# Altium footprint library Connectors THD.PcbLib: 631 footprints (part 23 of 46)
Each footprint in its own frame and in the unit in brackets; x right, y up, seen from the top. Pads: shape width x height; smd on the part's side, far side on the other; paste and mask are expansions set on the pad; w line width, h text height; cw(c..) or ccw(c..) is an arc to the next point about the centre after c.
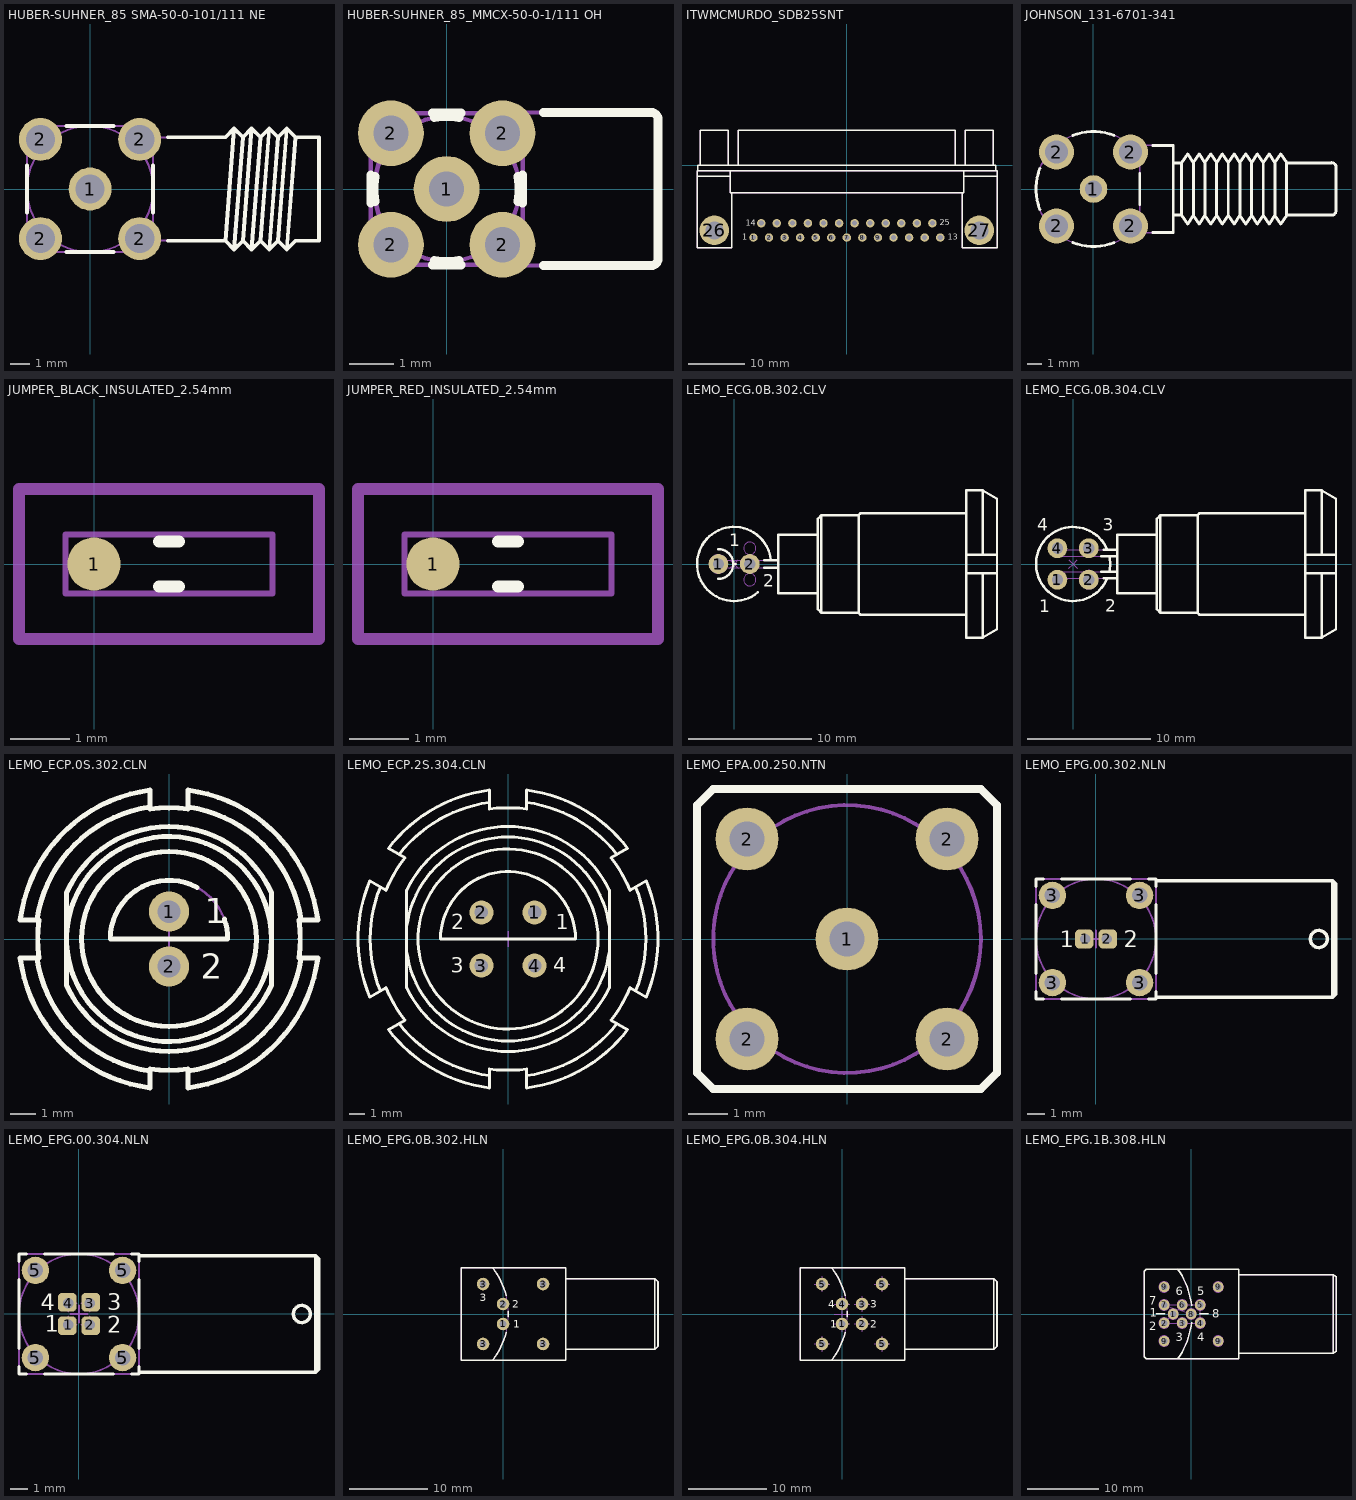
[diagram p22: the footprints below, top view; thin cyan lines are the x and y axes]

## HUBER-SUHNER_85 SMA-50-0-101/111 NE [mm] "50 Ohm SMA Right Angle PCB Jack"
height 9.6
pads (5):
  round 2.2 hole 1.5: 1(0,0) 2(-2.54,-2.54) 2(-2.54,2.54) 2(2.54,-2.54) 2(2.54,2.54)
Top Overlay:
  lines w0.2: -3.23,-1.208 -3.23,1.208 ; -1.208,-3.23 1.208,-3.23 ; -1.208,3.23 1.208,3.23 ; 3.23,-1.208 3.23,1.208 ; 4,-2.65 6.93,-2.65 ; 4,2.65 6.93,2.65 7.38,3.1 ; 6.93,-2.65 7.38,-3.1 ; 6.93,-2.65 7.38,3.1 ; 7.38,-3.1 7.83,-2.65 ; 7.38,-3.1 7.83,2.65 ; 7.38,3.1 7.83,2.65 ; 7.83,-2.65 8.28,-3.1 ; 7.83,-2.65 8.28,3.1 ; 7.83,2.65 8.28,3.1 ; 8.28,-3.1 8.73,-2.65 ; 8.28,-3.1 8.73,2.65 ; 8.28,3.1 8.73,2.65 ; 8.73,-2.65 9.18,-3.1 ; 8.73,-2.65 9.18,3.1 ; 8.73,2.65 9.18,3.1 ; 9.18,-3.1 9.63,-2.65 ; 9.18,-3.1 9.63,2.65 ; 9.18,3.1 9.63,2.65 ; 9.63,-2.65 10.08,-3.1 ; 9.63,-2.65 10.08,3.1 ; 9.63,2.65 10.08,3.1 ; 10.08,-3.1 10.53,-2.65 11.73,-2.65 11.73,2.65 10.53,2.65 ; 10.08,-3.1 10.53,2.65 ; 10.08,3.1 10.53,2.65
Mechanical 8:
  lines w0.1: -3.54,-2.54 -2.54,-2.54 ; -3.54,2.54 -2.54,2.54 ; -2.54,-3.54 -2.54,-2.54 ; -2.54,-1.54 -2.54,-2.54 ; -2.54,1.54 -2.54,2.54 ; -2.54,3.54 -2.54,2.54 ; -1.54,-2.54 -2.54,-2.54 ; -1.54,2.54 -2.54,2.54 ; -1,0 0,0 ; 0,-1 0,0 ; 0,1 0,0 ; 1,0 0,0 ; 1.54,-2.54 2.54,-2.54 ; 1.54,2.54 2.54,2.54 ; 2.54,-3.54 2.54,-2.54 ; 2.54,-1.54 2.54,-2.54 ; 2.54,1.54 2.54,2.54 ; 2.54,3.54 2.54,2.54 ; 3.54,-2.54 2.54,-2.54 ; 3.54,2.54 2.54,2.54
Mechanical 14:
  circle w0.1: c0,0 r0.63
  circle w0.1: c0,0 r3.23
  lines w0.1: 2.558,-3.23 3.23,-2.558 ; 3.23,-2.65 6.93,-2.65 ; 3.23,2.65 6.93,2.65 7.38,3.1 ; 6.93,-2.65 7.38,-3.1 ; 6.93,-2.65 7.38,3.1 ; 7.38,-3.1 7.83,-2.65 ; 7.38,-3.1 7.83,2.65 ; 7.38,3.1 7.83,2.65 ; 7.83,-2.65 8.28,-3.1 ; 7.83,-2.65 8.28,3.1 ; 7.83,2.65 8.28,3.1 ; 8.28,-3.1 8.73,-2.65 ; 8.28,-3.1 8.73,2.65 ; 8.28,3.1 8.73,2.65 ; 8.73,-2.65 9.18,-3.1 ; 8.73,-2.65 9.18,3.1 ; 8.73,2.65 9.18,3.1 ; 9.18,-3.1 9.63,-2.65 ; 9.18,-3.1 9.63,2.65 ; 9.18,3.1 9.63,2.65 ; 9.63,-2.65 10.08,-3.1 ; 9.63,-2.65 10.08,3.1 ; 9.63,2.65 10.08,3.1 ; 10.08,-3.1 10.53,-2.65 11.73,-2.65 11.73,2.65 10.53,2.65 ; 10.08,-3.1 10.53,2.65 ; 10.08,3.1 10.53,2.65 ; -3.23,-3.23 -3.23,3.23 3.23,3.23 3.23,-3.23 -3.23,-3.23
3D body: height 9.6, standoff -4, extent -3.23,-3.23 11.73,3.23

## HUBER-SUHNER_85_MMCX-50-0-1/111 OH [mm] "MMCX 50 Ohm Right Angle PCB Jack"
height 3.8
pads (5):
  round 1.5 hole 0.8: 1(0,0) 2(-1.27,-1.27) 2(-1.27,1.27) 2(1.27,-1.27) 2(1.27,1.27)
Top Overlay:
  lines w0.2: -1.73,-0.326 -1.73,0.326 ; -1.626,-0.282 cw(c0,0) -1.626,0.282 ; -0.326,-1.73 0.326,-1.73 ; -0.326,1.73 0.326,1.73 ; -0.282,-1.626 ccw(c0,0) 0.282,-1.626 ; -0.282,1.626 cw(c0,0) 0.282,1.626 ; 1.626,-0.282 ccw(c0,0) 1.626,0.282 ; 2.208,-1.743 4.665,-1.743 ccw(c4.665,-1.593) 4.815,-1.593 4.815,1.593 ccw(c4.665,1.593) 4.665,1.743 2.208,1.743 ; 1.73,-0.326 1.73,0.326 1.73,-0.326
Mechanical 8:
  lines w0.1: -1.77,-1.27 -1.27,-1.27 ; -1.77,1.27 -1.27,1.27 ; -1.27,-1.77 -1.27,-1.27 ; -1.27,-0.77 -1.27,-1.27 ; -1.27,0.77 -1.27,1.27 ; -1.27,1.77 -1.27,1.27 ; -0.77,-1.27 -1.27,-1.27 ; -0.77,1.27 -1.27,1.27 ; -0.5,0 0,0 ; 0,-0.5 0,0 ; 0,0.5 0,0 ; 0.5,0 0,0 ; 0.77,-1.27 1.27,-1.27 ; 0.77,1.27 1.27,1.27 ; 1.27,-1.77 1.27,-1.27 ; 1.27,-0.77 1.27,-1.27 ; 1.27,0.77 1.27,1.27 ; 1.27,1.77 1.27,1.27 ; 1.77,-1.27 1.27,-1.27 ; 1.77,1.27 1.27,1.27
Mechanical 14:
  circle w0.1: c0,0 r1.65
  lines w0.1: -1.73,-1.73 1.73,-1.73 1.73,1.73 -1.73,1.73 -1.73,-1.73 ; 1.73,-1.743 1.73,1.743 4.665,1.743 cw(c4.665,1.593) 4.815,1.593 4.815,-1.593 cw(c4.665,-1.593) 4.665,-1.743 1.73,-1.743
3D body: height 3.8, standoff -3, extent -1.73,-1.742 4.815,1.743

## ITWMCMURDO_SDB25SNT [mm] "25 Way Right Angled Female D-sub Connector"
height 12.5
pads (27):
  round 1.5 hole 0.9: 1(-16.56,-12.84) 2(-13.8,-12.84) 3(-11.04,-12.84) 4(-8.28,-12.84) 5(-5.52,-12.84) 6(-2.76,-12.84) 7(0,-12.84) 8(2.76,-12.84) 9(5.52,-12.84) 10(8.28,-12.84) 11(11.04,-12.84) 12(13.8,-12.84) 13(16.56,-12.84) 14(-15.18,-10.3) 15(-12.42,-10.3) 16(-9.66,-10.3) 17(-6.9,-10.3) 18(-4.14,-10.3) 19(-1.38,-10.3) 20(1.38,-10.3) 21(4.14,-10.3) 22(6.9,-10.3) 23(9.66,-10.3) 24(12.42,-10.3) 25(15.18,-10.3)
  round 5.25 hole 3.2: 26(-23.5,-11.57) 27(23.5,-11.57)
Top Overlay:
  lines w0.254: -26.571,-2 -20.671,-2 ; -26.45,-1 -26.45,0 26.45,0 26.45,-1 ; -26,0 -26,6.2 -21,6.2 -21,0 ; -20.671,-1 -20.671,-4.9 20.729,-4.9 20.729,-1 ; -20.371,-4.9 -20.371,-14.67 -26.571,-14.67 -26.571,-1 26.629,-1 26.629,-14.67 20.429,-14.67 20.429,-4.9 ; -19.25,0 -19.25,6.2 19.25,6.2 19.25,0 ; 20.729,-2 26.629,-2 ; 21,0 21,6.2 26,6.2 26,0
  text "25" at 16.51,-10.668 h1.02
  text "14" at -17.907,-10.795 h1.02
  text "13" at 17.907,-13.208 h1.02
  text "1" at -18.542,-13.208 h1.02
Mechanical 14:
  lines w0.1: -26.571,-2 -20.671,-2 ; -26.45,-1 -26.45,0 26.45,0 26.45,-1 ; -26,0 -26,6.2 -21,6.2 -21,0 ; -20.671,-1 -20.671,-4.9 20.729,-4.9 20.729,-1 ; -20.371,-4.9 -20.371,-14.67 -26.571,-14.67 -26.571,-1 26.629,-1 26.629,-14.67 20.429,-14.67 20.429,-4.9 ; -19.25,0 -19.25,6.2 19.25,6.2 19.25,0 ; 20.729,-2 26.629,-2 ; 21,0 21,6.2 26,6.2 26,0
  text "25" at 16.51,-10.668 h1.02
  text "14" at -17.907,-10.795 h1.02
  text "13" at 17.907,-13.208 h1.02
  text "1" at -18.542,-13.208 h1.02
3D body: height 12.93, standoff -5, extent -26.71,-14.67 26.71,6.2

## JOHNSON_131-6701-341 [mm] "Right Angle Bulkhead SMC"
height 7.67
pads (5):
  round 1.9 hole 1.2: 1(0,0)
  round 2.4 hole 1.6: 2(-2.54,-2.54) 2(-2.54,2.54) 2(2.54,-2.54) 2(2.54,2.54)
Top Overlay:
  lines w0.2: -3.685,-1.422 cw(c0,0) -3.685,1.422 ; -1.422,-3.685 ccw(c0,0) 1.422,-3.685 ; -1.422,3.685 cw(c0,0) 1.422,3.685 ; 3.18,-1.074 3.18,1.074 ; 4.072,-3 5.48,-3 5.48,3 4.072,3 ; 5.48,-1.8 6.06,-1.8 ; 5.48,1.8 6.06,1.8 ; 6.86,1.8 6.86,-1.81 ; 7.66,1.8 7.66,-1.81 ; 8.46,1.8 8.46,-1.81 ; 9.26,1.8 9.26,-1.81 ; 10.06,1.8 10.06,-1.81 ; 10.86,1.8 10.86,-1.81 ; 11.66,1.8 11.66,-1.81 ; 12.46,1.8 12.46,-1.81 ; 13.26,-1.8 16.36,-1.8 ccw(c16.36,-1.5) 16.66,-1.5 16.66,1.5 ccw(c16.36,1.507) 16.296,1.8 ; 13.26,1.81 12.86,2.41 12.46,1.81 12.06,2.41 11.66,1.81 11.26,2.41 10.86,1.81 10.46,2.41 10.06,1.81 9.66,2.41 9.26,1.81 8.86,2.41 8.46,1.81 8.06,2.41 7.66,1.81 7.26,2.41 6.86,1.81 6.46,2.41 6.06,1.81 6.06,-1.81 6.46,-2.41 6.86,-1.81 ; 16.36,1.8 13.26,1.8 13.26,-1.81 12.86,-2.41 12.46,-1.81 ; 6.86,-1.81 7.26,-2.41 7.66,-1.81 ; 7.66,-1.81 8.06,-2.41 8.46,-1.81 ; 8.46,-1.81 8.86,-2.41 9.26,-1.81 ; 9.26,-1.81 9.66,-2.41 10.06,-1.81 ; 10.06,-1.81 10.46,-2.41 10.86,-1.81 ; 10.86,-1.81 11.26,-2.41 11.66,-1.81 ; 11.66,-1.81 12.06,-2.41 12.46,-1.81
Mechanical 8:
  lines w0.1: -3.04,-2.54 -2.54,-2.54 ; -3.04,2.54 -2.54,2.54 ; -2.54,-3.04 -2.54,-2.54 ; -2.54,-2.04 -2.54,-2.54 ; -2.54,2.04 -2.54,2.54 ; -2.54,3.04 -2.54,2.54 ; -2.04,-2.54 -2.54,-2.54 ; -2.04,2.54 -2.54,2.54 ; -0.5,0 0,0 ; 0,-0.5 0,0 ; 0,0.5 0,0 ; 0.5,0 0,0 ; 2.04,-2.54 2.54,-2.54 ; 2.04,2.54 2.54,2.54 ; 2.54,-3.04 2.54,-2.54 ; 2.54,-2.04 2.54,-2.54 ; 2.54,2.04 2.54,2.54 ; 2.54,3.04 2.54,2.54 ; 3.04,-2.54 2.54,-2.54 ; 3.04,2.54 2.54,2.54
Mechanical 14:
  lines w0.1: 3.18,-2.343 cw(c0,0) 3.18,2.343 ; 5.48,-1.8 6.06,-1.8 ; 5.48,1.8 6.06,1.8 ; 6.86,1.8 6.86,-1.81 ; 7.66,1.8 7.66,-1.81 ; 8.46,1.8 8.46,-1.81 ; 9.26,1.8 9.26,-1.81 ; 10.06,1.8 10.06,-1.81 ; 10.86,1.8 10.86,-1.81 ; 11.66,1.8 11.66,-1.81 ; 12.46,1.8 12.46,-1.81 ; 13.26,-1.8 16.36,-1.8 ccw(c16.36,-1.5) 16.66,-1.5 16.66,1.5 ccw(c16.36,1.507) 16.296,1.8 ; 13.26,1.81 12.86,2.41 12.46,1.81 12.06,2.41 11.66,1.81 11.26,2.41 10.86,1.81 10.46,2.41 10.06,1.81 9.66,2.41 9.26,1.81 8.86,2.41 8.46,1.81 8.06,2.41 7.66,1.81 7.26,2.41 6.86,1.81 6.46,2.41 6.06,1.81 6.06,-1.81 6.46,-2.41 6.86,-1.81 ; 16.36,1.8 13.26,1.8 13.26,-1.81 12.86,-2.41 12.46,-1.81 ; 6.86,-1.81 7.26,-2.41 7.66,-1.81 ; 7.66,-1.81 8.06,-2.41 8.46,-1.81 ; 8.46,-1.81 8.86,-2.41 9.26,-1.81 ; 9.26,-1.81 9.66,-2.41 10.06,-1.81 ; 10.06,-1.81 10.46,-2.41 10.86,-1.81 ; 10.86,-1.81 11.26,-2.41 11.66,-1.81 ; 11.66,-1.81 12.06,-2.41 12.46,-1.81 ; 3.18,-3 5.48,-3 5.48,3 3.18,3 3.18,-3
3D body: height 7.67, standoff -3.9, extent -3.943,-3.945 16.66,3.943
3D body: height 8.3, standoff 0.7, extent 7.84,-3.8 10.14,3.8

## JUMPER_BLACK_INSULATED_2.54mm [mm] "Black Insulated Jumper Pitch 2.54mm W=2.5mm L=5mm H=6.5mm"
height 6.5
pads (1):
  round 0.9 smd paste-0.46 mask-0.46: 1(0,0)
Top Overlay:
  lines w0.2: 1.1,-0.381 1.44,-0.381 ; 1.1,0.381 1.44,0.381
Mechanical 13:
  lines w0.2: -1.27,-1.27 3.81,-1.27 3.81,1.27 -1.27,1.27 -1.27,-1.27
Mechanical 14:
  lines w0.1: -0.48,-0.5 3.02,-0.5 3.02,0.5 -0.48,0.5 -0.48,-0.5
3D body: height 8.2, standoff 1.7, extent -1.269,-1.269 3.731,1.231

## JUMPER_RED_INSULATED_2.54mm [mm] "Red Insulated Jumper Pitch 2.54mm W=2.5mm L=5mm H=6.5mm"
height 6.5
pads (1):
  round 0.9 smd paste-0.46 mask-0.46: 1(0,0)
Top Overlay:
  lines w0.2: 1.1,-0.381 1.44,-0.381 ; 1.1,0.381 1.44,0.381
Mechanical 13:
  lines w0.2: -1.27,-1.27 -1.27,1.27 3.81,1.27 3.81,-1.27 -1.27,-1.27
Mechanical 14:
  lines w0.1: -0.48,-0.5 -0.48,0.5 3.02,0.5 3.02,-0.5 -0.48,-0.5
3D body: height 8.2, standoff 1.7, extent -1.269,-1.269 3.731,1.231

## LEMO_ECG.0B.302.CLV [mm] "Size 0B, 2 Female Contacts Elbow Receptacle (90°) With Two Nut For Panel Mounting"
height 15.5
pads (2):
  round 1.6 hole 0.9: 1(-1.27,0) 2(1.27,0)
Top Overlay:
  lines w0.2: -1.27,-1.2 ccw(c-1.27,0) -1.27,1.2 ; 0,0 0.125,0 ; 1.923,-2.303 cw(c0,0) 2.985,0.3 ; 2.432,-0.3 3.57,-0.3 ; 2.432,0.3 3.57,0.3 ; 6.77,-2.36 3.57,-2.36 3.57,2.36 6.77,2.36 ; 18.77,-4.1 10.22,-4.1 10.07,-3.95 ; 18.77,-0.75 21.27,-0.75 ; 18.77,0.75 21.27,0.75 ; 18.77,4.1 10.22,4.1 10.07,3.95 ; 20.12,-0.75 20.12,-5.953 ; 20.12,0.75 20.12,5.953 ; 7.07,-3.95 6.77,-3.65 6.77,3.65 7.07,3.95 ; 7.07,-3.95 10.07,-3.95 ; 7.07,-3.95 7.07,3.95 ; 7.07,3.95 10.07,3.95 ; 10.07,-3.95 10.07,3.95 ; 20.12,-5.953 21.27,-5.283 21.27,5.283 20.12,5.953 ; 20.12,-5.953 18.77,-5.953 18.77,5.953 20.12,5.953
  text "2" at 2.352,-1.842 h1
  text "1" at -0.4,1.425 h1
Mechanical 8:
  lines w0.1: -1.77,0 -1.27,0 ; -1.27,-0.5 -1.27,0 ; -1.27,0.5 -1.27,0 ; -0.77,0 -1.27,0 ; -0.354,-0.354 0,0 ; -0.354,0.354 0,0 ; 0.354,-0.354 0,0 ; 0.354,0.354 0,0 ; 0.77,0 1.27,0 ; 1.27,-0.5 1.27,0 ; 1.27,0.5 1.27,0 ; 1.77,0 1.27,0
Mechanical 14:
  circle w0.1: c1.27,1.27 r0.498
  circle w0.1: c1.27,-1.27 r0.498
  lines w0.1: -1.27,-1.2 ccw(c-1.27,0) -1.27,1.2 ; -0.583,-0.3 cw(c-1.27,0) -0.583,0.3 ; 0,0 0.125,0 ; 0.872,-0.3 ccw(c1.27,0) 1.668,-0.3 ; 0.872,0.3 cw(c1.27,0) 1.668,0.3 ; 1.923,-2.303 cw(c0,0) 2.985,0.3 ; 3.57,-0.3 -1.27,-0.3 cw(c-1.27,0) -1.27,0.3 3.57,0.3 ; 6.77,-2.36 3.57,-2.36 3.57,2.36 6.77,2.36 ; 18.77,-4.1 10.22,-4.1 10.07,-3.95 ; 18.77,-0.75 21.27,-0.75 ; 18.77,0.75 21.27,0.75 ; 18.77,4.1 10.22,4.1 10.07,3.95 ; 20.12,-0.75 20.12,-5.953 ; 20.12,0.75 20.12,5.953 ; 7.07,-3.95 6.77,-3.65 6.77,3.65 7.07,3.95 ; 7.07,-3.95 10.07,-3.95 ; 7.07,-3.95 7.07,3.95 ; 7.07,3.95 10.07,3.95 ; 10.07,-3.95 10.07,3.95 ; 20.12,-5.953 21.27,-5.283 21.27,5.283 20.12,5.953 ; 20.12,-5.953 18.77,-5.953 18.77,5.953 20.12,5.953
  text "2" at 2.352,-1.842 h1
  text "1" at -0.4,1.425 h1
3D body: height 10.73, standoff -3.7, extent -1.57,-4.1 21.27,4.1
3D body: height 12.2, standoff 0.3, extent 18.77,-5.953 21.27,5.953
3D body: height 12.5, standoff 0, extent 15.27,-6.25 16.27,6.25
3D body: height 12.45, standoff 0.05, extent 13.265,-5.5 15.265,5.5
3D body: height 2.3, standoff 0, extent -3,-3 3,3
3D body: height -3.7, standoff -8.7, extent -1.57,-0.3 1.57,0.3
3D body: height -8.7, standoff -13.7, extent -1.57,-0.3 1.57,0.3
3D body: height -8.7, standoff -13.7, extent -1.57,-0.3 1.57,0.3
3D body: height -13.7, standoff -18.7, extent -1.57,-0.3 1.57,0.3
3D body: height -18.7, standoff -23.7, extent -1.57,-0.3 1.57,0.3
3D body: height -23.7, standoff -28.7, extent -1.57,-0.3 1.57,0.3
3D body: height -28.7, standoff -33.7, extent -1.57,-0.3 1.57,0.3
3D body: height -33.7, standoff -38.7, extent -1.57,-0.3 1.57,0.3

## LEMO_ECG.0B.304.CLV [mm] "Size 0B, 4 Female Contacts Elbow Receptacle (90°) With Two Nut For Panel Mounting"
height 15.5
pads (4):
  round 1.6 hole 0.9: 1(-1.27,-1.27) 2(1.27,-1.27) 3(1.27,1.27) 4(-1.27,1.27)
Top Overlay:
  lines w0.2: 2.288,-0.634 3.57,-0.634 ; 2.288,0.634 3.57,0.634 ; 2.462,-1.134 3.57,-1.134 ; 2.462,1.134 3.57,1.134 ; 2.777,-1.134 cw(c0,0) 2.777,1.134 ; 2.932,-0.634 ccw(c0,0) 2.932,0.634 ; 6.77,-2.36 3.57,-2.36 3.57,2.36 6.77,2.36 ; 18.77,-4.1 10.22,-4.1 10.07,-3.95 ; 18.77,-0.75 21.27,-0.75 ; 18.77,0.75 21.27,0.75 ; 18.77,4.1 10.22,4.1 10.07,3.95 ; 20.12,-0.75 20.12,-5.953 ; 20.12,0.75 20.12,5.953 ; 21.27,-4.1 21.27,4.1 ; 7.07,-3.95 7.07,3.95 ; 7.07,-3.95 10.07,-3.95 ; 7.07,-3.95 6.77,-3.65 6.77,3.65 7.07,3.95 ; 7.07,3.95 10.07,3.95 ; 10.07,-3.95 10.07,3.95 ; 20.12,-5.953 18.77,-5.953 18.77,5.953 20.12,5.953 ; 20.12,-5.953 21.27,-5.283 21.27,5.283 20.12,5.953
  text "2" at 2.602,-3.868 h1
  text "1" at -2.75,-3.9 h1
  text "3" at 2.402,2.708 h1
  text "4" at -2.898,2.708 h1
Mechanical 8:
  lines w0.1: -1.77,-1.27 -1.27,-1.27 ; -1.77,1.27 -1.27,1.27 ; -1.27,-1.77 -1.27,-1.27 ; -1.27,-0.77 -1.27,-1.27 ; -1.27,0.77 -1.27,1.27 ; -1.27,1.77 -1.27,1.27 ; -0.77,-1.27 -1.27,-1.27 ; -0.77,1.27 -1.27,1.27 ; -0.354,-0.354 0,0 ; -0.354,0.354 0,0 ; 0.354,-0.354 0,0 ; 0.354,0.354 0,0 ; 0.77,-1.27 1.27,-1.27 ; 0.77,1.27 1.27,1.27 ; 1.27,-1.77 1.27,-1.27 ; 1.27,-0.77 1.27,-1.27 ; 1.27,0.77 1.27,1.27 ; 1.27,1.77 1.27,1.27 ; 1.77,-1.27 1.27,-1.27 ; 1.77,1.27 1.27,1.27
Mechanical 14:
  lines w0.1: -1.514,-1.055 ccw(c-1.27,-1.27) -0.969,-1.147 ; -1.514,1.055 cw(c-1.27,1.27) -0.969,1.147 ; 0.532,-1.134 ccw(c1.27,-1.27) 2.008,-1.134 ; 0.873,-0.634 cw(c1.27,-1.27) 1.667,-0.634 ; 0.975,1.134 cw(c1.27,1.27) 1.565,1.134 ; 1.02,-1.134 1.02,-1.27 ccw(c1.27,-1.27) 1.52,-1.27 1.52,-1.134 ; 1.02,1.134 1.02,1.27 cw(c1.27,1.27) 1.52,1.27 1.52,1.134 ; 2.777,-1.134 cw(c0,0) 2.777,1.134 ; 2.932,-0.634 ccw(c0,0) 2.932,0.634 ; 3.57,-1.134 -0.92,-1.134 ccw(c-0.92,-1.234) -1.02,-1.234 -1.02,-1.27 cw(c-1.27,-1.27) -1.52,-1.27 -1.52,-1.134 cw(c-1.02,-1.134) -1.02,-0.634 3.57,-0.634 ; 3.57,0.634 -1.02,0.634 cw(c-1.02,1.134) -1.52,1.134 -1.52,1.27 cw(c-1.27,1.27) -1.02,1.27 -1.02,1.234 ccw(c-0.92,1.234) -0.92,1.134 3.57,1.134 ; 6.77,-2.36 3.57,-2.36 3.57,2.36 6.77,2.36 ; 18.77,-4.1 10.22,-4.1 10.07,-3.95 ; 18.77,-0.75 21.27,-0.75 ; 18.77,0.75 21.27,0.75 ; 18.77,4.1 10.22,4.1 10.07,3.95 ; 20.12,-0.75 20.12,-5.953 ; 20.12,0.75 20.12,5.953 ; 21.27,-4.1 21.27,4.1 ; 7.07,-3.95 7.07,3.95 ; 7.07,-3.95 10.07,-3.95 ; 7.07,-3.95 6.77,-3.65 6.77,3.65 7.07,3.95 ; 7.07,3.95 10.07,3.95 ; 10.07,-3.95 10.07,3.95 ; 20.12,-5.953 18.77,-5.953 18.77,5.953 20.12,5.953 ; 20.12,-5.953 21.27,-5.283 21.27,5.283 20.12,5.953
  text "2" at 2.602,-3.868 h1
  text "1" at -2.75,-3.9 h1
  text "3" at 2.402,2.708 h1
  text "4" at -2.898,2.708 h1
3D body: height -33.7, standoff -38.7, extent -1.52,-1.52 1.52,1.52
3D body: height -28.7, standoff -33.7, extent -1.52,-1.52 1.52,1.52
3D body: height -23.7, standoff -28.7, extent -1.52,-1.52 1.52,1.52
3D body: height -8.7, standoff -13.7, extent -1.52,-1.52 1.52,1.52
3D body: height -3.7, standoff -8.7, extent -1.52,-1.52 1.52,1.52
3D body: height 12.2, standoff 0.3, extent 18.77,-5.953 21.27,5.953
3D body: height 10.75, standoff -3.7, extent -1.52,-4.1 21.27,4.1
3D body: height 12.5, standoff 0, extent 15.27,-6.25 16.27,6.25
3D body: height 12.45, standoff 0.05, extent 13.265,-5.5 15.265,5.5
3D body: height 2.3, standoff 0, extent -3,-3 3,3
3D body: height -13.7, standoff -18.7, extent -1.52,-1.52 1.52,1.52
3D body: height -18.7, standoff -23.7, extent -1.52,-1.52 1.52,1.52

## LEMO_ECP.0S.302.CLN [mm] "Size 0S, Fixed Receptacle with 2 Nuts, Straight Contacts 1 Female + 1 Male  (Hermaphroditic Keying)"
height 15
pads (2):
  round 1.6 hole 0.9: 1(0,1.1) 2(0,-1.1)
Top Overlay:
  circle w0.2: c0,0 r4.1
  circle w0.2: c0,0 r3.5
  lines w0.2: -5.283,-0.75 ccw(c0,0) -0.75,-5.283 ; -5.283,0.75 cw(c0,0) -0.75,5.283 ; 0.75,-5.283 ccw(c0,0) 5.283,-0.75 ; 0.75,5.283 cw(c0,0) 5.283,0.75 ; 1.114,2.069 ccw(c0,0) -2.35,0 2.35,0 ccw(c0,0) 2.213,0.79 ; -5.953,-0.75 ccw(c0,0) -0.75,-5.953 -0.75,-5.196 ccw(c0,0) 0.75,-5.196 0.75,-5.953 ccw(c0,0) 5.953,-0.75 5.196,-0.75 ccw(c0,0) 5.196,0.75 5.953,0.75 ccw(c0,0) 0.75,5.953 0.75,5.196 ccw(c0,0) -0.75,5.196 -0.75,5.953 ccw(c0,0) -5.953,0.75 -5.196,0.75 ccw(c0,0) -5.196,-0.75 -5.953,-0.75 ; -4.1,-1.855 ccw(c0,0) 4.1,-1.855 4.1,1.855 ccw(c0,0) -4.1,1.855 -4.1,-1.855
  text "1" at 1.429,0.635 h1
  text "2" at 1.27,-1.587 h1
Mechanical 8:
  lines w0.1: -0.5,-1.1 0,-1.1 ; -0.5,0 0,0 ; -0.5,1.1 0,1.1 ; 0,-1.6 0,-1.1 ; 0,-0.6 0,-1.1 ; 0,-0.5 0,0 ; 0,0.5 0,0 ; 0,0.6 0,1.1 ; 0,1.6 0,1.1 ; 0.5,-1.1 0,-1.1 ; 0.5,0 0,0 ; 0.5,1.1 0,1.1
Mechanical 14:
  circle w0.1: c0,0 r4.1
  circle w0.1: c0,0 r3.5
  circle w0.1: c0,1.1 r0.35
  circle w0.4: c0,-1.1 r0.2
  circle w0.1: c0,-1.1 r0.35
  lines w0.1: -5.283,-0.75 ccw(c0,0) -0.75,-5.283 ; -5.283,0.75 cw(c0,0) -0.75,5.283 ; 0.75,-5.283 ccw(c0,0) 5.283,-0.75 ; 0.75,5.283 cw(c0,0) 5.283,0.75 ; -5.953,-0.75 ccw(c0,0) -0.75,-5.953 -0.75,-5.196 ccw(c0,0) 0.75,-5.196 0.75,-5.953 ccw(c0,0) 5.953,-0.75 5.196,-0.75 ccw(c0,0) 5.196,0.75 5.953,0.75 ccw(c0,0) 0.75,5.953 0.75,5.196 ccw(c0,0) -0.75,5.196 -0.75,5.953 ccw(c0,0) -5.953,0.75 -5.196,0.75 ccw(c0,0) -5.196,-0.75 -5.953,-0.75 ; -4.1,-1.855 ccw(c0,0) 4.1,-1.855 4.1,1.855 ccw(c0,0) -4.1,1.855 -4.1,-1.855 ; -2.35,0 cw(c0,0) 2.35,0 -2.35,0
  text "1" at 1.429,0.635 h1
  text "2" at 1.27,-1.587 h1
3D body: height 15, standoff -3.2, extent -6.25,-6.25 6.25,6.216

## LEMO_ECP.2S.304.CLN [mm] "Size 2S, Fixed Receptacle with 2 Nuts, Straight Contacts 2 Females + 2 Males  (Hermaphroditic Keying)"
height 20
pads (4):
  round 1.6 hole 0.9: 1(1.768,1.768) 2(-1.768,1.768) 3(-1.768,-1.768) 4(1.768,-1.768)
Top Overlay:
  circle w0.2: c0,0 r6
  lines w0.2: -8.511,-3.471 cw(c0,0) -8.511,3.471 ; -7.261,-5.636 ccw(c0,0) -1.25,-9.106 ; -7.261,5.636 cw(c0,0) -1.25,9.106 ; -6.75,-0.823 ccw(c0,0) 6.75,-0.823 ; -6.75,0.823 cw(c0,0) 6.75,0.823 ; 1.25,-9.106 ccw(c0,0) 7.261,-5.636 ; 1.25,9.106 cw(c0,0) 7.261,5.636 ; 8.511,-3.471 ccw(c0,0) 8.511,3.471 ; -9.217,-3.878 cw(c0,0) -9.217,3.878 -8.125,3.248 cw(c0,0) -6.875,5.413 -7.967,6.043 cw(c0,0) -1.25,9.922 -1.25,8.66 cw(c0,0) 1.25,8.66 1.25,9.922 cw(c0,0) 7.967,6.043 6.875,5.413 cw(c0,0) 8.125,3.248 9.217,3.878 cw(c0,0) 9.217,-3.878 8.125,-3.248 cw(c0,0) 6.875,-5.413 7.967,-6.043 cw(c0,0) 1.25,-9.922 1.25,-8.66 cw(c0,0) -1.25,-8.66 -1.25,-9.922 cw(c0,0) -7.967,-6.043 -6.875,-5.413 cw(c0,0) -8.125,-3.248 -9.217,-3.878 ; -6.75,-3.269 ccw(c0,0) 6.75,-3.269 6.75,3.269 ccw(c0,0) -6.75,3.269 -6.75,-3.269 ; -4.5,0 cw(c0,0) 4.5,0 -4.5,0
  text "2" at -3.788,0.635 h1
  text "3" at -3.81,-2.244 h1
  text "4" at 3.016,-2.222 h1
  text "1" at 3.197,0.635 h1
Mechanical 8:
  lines w0.1: -2.268,-1.768 -1.768,-1.768 ; -2.268,1.768 -1.768,1.768 ; -1.768,-2.268 -1.768,-1.768 ; -1.768,-1.268 -1.768,-1.768 ; -1.768,1.268 -1.768,1.768 ; -1.768,2.268 -1.768,1.768 ; -1.268,-1.768 -1.768,-1.768 ; -1.268,1.768 -1.768,1.768 ; -0.5,0 0,0 ; 0,-0.5 0,0 ; 0,0.5 0,0 ; 0.5,0 0,0 ; 1.268,-1.768 1.768,-1.768 ; 1.268,1.768 1.768,1.768 ; 1.768,-2.268 1.768,-1.768 ; 1.768,-1.268 1.768,-1.768 ; 1.768,1.268 1.768,1.768 ; 1.768,2.268 1.768,1.768 ; 2.268,-1.768 1.768,-1.768 ; 2.268,1.768 1.768,1.768
Mechanical 14:
  circle w0.1: c0,0 r6
  circle w0.1: c1.768,1.768 r0.7
  circle w0.1: c-1.768,1.768 r0.7
  circle w0.1: c1.768,-1.768 r0.7
  circle w0.1: c-1.768,-1.768 r0.7
  circle w0.7: c-1.768,-1.768 r0.35
  circle w0.7: c1.768,-1.768 r0.35
  lines w0.1: -8.511,-3.471 cw(c0,0) -8.511,3.471 ; -7.261,-5.636 ccw(c0,0) -1.25,-9.106 ; -7.261,5.636 cw(c0,0) -1.25,9.106 ; -6.75,-0.823 ccw(c0,0) 6.75,-0.823 ; -6.75,0.823 cw(c0,0) 6.75,0.823 ; 1.25,-9.106 ccw(c0,0) 7.261,-5.636 ; 1.25,9.106 cw(c0,0) 7.261,5.636 ; 8.511,-3.471 ccw(c0,0) 8.511,3.471 ; -9.217,-3.878 cw(c0,0) -9.217,3.878 -8.125,3.248 cw(c0,0) -6.875,5.413 -7.967,6.043 cw(c0,0) -1.25,9.922 -1.25,8.66 cw(c0,0) 1.25,8.66 1.25,9.922 cw(c0,0) 7.967,6.043 6.875,5.413 cw(c0,0) 8.125,3.248 9.217,3.878 cw(c0,0) 9.217,-3.878 8.125,-3.248 cw(c0,0) 6.875,-5.413 7.967,-6.043 cw(c0,0) 1.25,-9.922 1.25,-8.66 cw(c0,0) -1.25,-8.66 -1.25,-9.922 cw(c0,0) -7.967,-6.043 -6.875,-5.413 cw(c0,0) -8.125,-3.248 -9.217,-3.878 ; -6.75,-3.269 ccw(c0,0) 6.75,-3.269 6.75,3.269 ccw(c0,0) -6.75,3.269 -6.75,-3.269 ; -4.5,0 cw(c0,0) 4.5,0 -4.5,0
  text "2" at -3.788,0.635 h1
  text "3" at -3.81,-2.244 h1
  text "4" at 3.016,-2.222 h1
  text "1" at 3.197,0.635 h1
3D body: height 20, standoff -3, extent -9.968,-9.921 9.968,9.922

## LEMO_EPA.00.250.NTN [mm] "50 Ohm size 00 Coaxial Straight socket"
height 14
pads (5):
  round 1.6 hole 0.9: 1(0,0) 2(-2.54,-2.54) 2(-2.54,2.54) 2(2.54,-2.54) 2(2.54,2.54)
Top Overlay:
  lines w0.2: -3.81,-3.4 -3.4,-3.81 3.4,-3.81 3.81,-3.4 3.81,3.4 3.4,3.81 -3.4,3.81 -3.81,3.4 -3.81,-3.4
Mechanical 14:
  circle w0.1: c0,0 r3.4
  lines w0.1: -3.81,-3.39 -3.81,3.39 -3.39,3.81 3.4,3.81 3.81,3.4 3.81,-3.39 3.39,-3.81 -3.39,-3.81 -3.81,-3.39
3D body: height 14, standoff -3, extent -3.5,-3.5 3.5,3.5

## LEMO_EPG.00.302.NLN [mm] "Multipole 2 Contacts, 50 Ohm size 00 Coaxial Elbow (90°) Socket With Key"
height 7
pads (6):
  rrect50% 1.1x1.1 hole 0.6 copper offset -0.05,0: 1(-0.635,0)
  rrect50% 1.1x1.1 hole 0.6 copper offset 0.05,0: 2(0.635,0)
  round 1.6 hole 0.9: 3(-2.54,-2.54) 3(-2.54,2.54) 3(2.54,-2.54) 3(2.54,2.54)
Top Overlay:
  circle w0.2: c13,0 r0.5
  lines w0.2: -3.5,-3.077 -3.5,-3.5 -3.077,-3.5 ; -3.5,-2.003 -3.5,2.003 ; -3.5,3.077 -3.5,3.5 -3.077,3.5 ; -2.003,-3.5 2.003,-3.5 ; -2.003,3.5 2.003,3.5 ; 3.077,-3.5 3.5,-3.5 3.5,-3.077 ; 3.077,3.5 3.5,3.5 3.5,3.077 ; 3.5,-3.4 13.8,-3.4 ; 3.5,-2.003 3.5,2.003 ; 3.5,3.399 13.8,3.4 ; 13.8,-3.4 13.8,3.4 ; 13.8,-3.4 14,-3.2 14,3.2 13.8,3.4
  text "2" at 1.613,-0.473 h0.97
  text "1" at -2.119,-0.48 h0.97
Mechanical 8:
  lines w0.1: -3.04,-2.54 -2.54,-2.54 ; -3.04,2.54 -2.54,2.54 ; -2.54,-3.04 -2.54,-2.54 ; -2.54,-2.04 -2.54,-2.54 ; -2.54,2.04 -2.54,2.54 ; -2.54,3.04 -2.54,2.54 ; -2.04,-2.54 -2.54,-2.54 ; -2.04,2.54 -2.54,2.54 ; -1.1,0 -0.6,0 ; -0.6,-0.5 -0.6,0 ; -0.6,0.5 -0.6,0 ; -0.5,0 0,0 ; -0.1,0 -0.6,0 ; 0,-0.5 0,0 ; 0,0.5 0,0 ; 0.1,0 0.6,0 ; 0.5,0 0,0 ; 0.6,-0.5 0.6,0 ; 0.6,0.5 0.6,0 ; 1.1,0 0.6,0 ; 2.04,-2.54 2.54,-2.54 ; 2.04,2.54 2.54,2.54 ; 2.54,-3.04 2.54,-2.54 ; 2.54,-2.04 2.54,-2.54 ; 2.54,2.04 2.54,2.54 ; 2.54,3.04 2.54,2.54 ; 3.04,-2.54 2.54,-2.54 ; 3.04,2.54 2.54,2.54
Mechanical 14:
  circle w0.1: c13,0 r0.5
  circle w0.1: c0,0 r3.5
  lines w0.1: 3.5,-3.4 13.8,-3.4 ; 3.5,3.399 13.8,3.4 ; 13.8,-3.4 13.8,3.4 ; 13.8,-3.4 14,-3.2 14,3.2 13.8,3.4 ; -3.5,-3.5 -3.5,3.5 3.5,3.5 3.5,-3.5 -3.5,-3.5
  text "2" at 1.613,-0.473 h0.97
  text "1" at -2.119,-0.48 h0.97
3D body: height 7, standoff -3, extent -3.5,-3.5 14,3.5

## LEMO_EPG.00.304.NLN [mm] "Multipole 4 Contacts, 50 Ohm size 00 Coaxial Elbow (90°) Socket With Key"
height 7
pads (8):
  rrect50% 1.1x1.1 hole 0.6 copper offset -0.05,-0.05: 1(-0.635,-0.635)
  rrect50% 1.1x1.1 hole 0.6 copper offset 0.05,-0.05: 2(0.635,-0.635)
  rrect50% 1.1x1.1 hole 0.6 copper offset 0.05,0.05: 3(0.635,0.635)
  rrect50% 1.1x1.1 hole 0.6 copper offset -0.05,0.05: 4(-0.635,0.635)
  round 1.6 hole 0.9: 5(-2.54,-2.54) 5(-2.54,2.54) 5(2.54,-2.54) 5(2.54,2.54)
Top Overlay:
  circle w0.2: c13,0 r0.5
  lines w0.2: -3.5,-3.077 -3.5,-3.5 -3.077,-3.5 ; -3.5,-2.003 -3.5,2.003 ; -3.5,3.077 -3.5,3.5 -3.077,3.5 ; -2.003,-3.5 2.003,-3.5 ; -2.003,3.5 2.003,3.5 ; 3.077,-3.5 3.5,-3.5 3.5,-3.077 ; 3.077,3.5 3.5,3.5 3.5,3.077 ; 3.5,-3.4 13.8,-3.4 ; 3.5,-2.003 3.5,2.003 ; 3.5,3.399 13.8,3.4 ; 13.8,-3.4 13.8,3.4 ; 13.8,-3.4 14,-3.2 14,3.2 13.8,3.4
  text "2" at 1.648,-1.108 h0.97
  text "3" at 1.652,0.208 h0.97
  text "4" at -2.231,0.232 h0.97
  text "1" at -2.007,-1.048 h0.97
Mechanical 8:
  lines w0.1: -3.04,-2.54 -2.54,-2.54 ; -3.04,2.54 -2.54,2.54 ; -2.54,-3.04 -2.54,-2.54 ; -2.54,-2.04 -2.54,-2.54 ; -2.54,2.04 -2.54,2.54 ; -2.54,3.04 -2.54,2.54 ; -2.04,-2.54 -2.54,-2.54 ; -2.04,2.54 -2.54,2.54 ; -1.135,-0.635 -0.635,-0.635 ; -1.135,0.635 -0.635,0.635 ; -0.635,-1.135 -0.635,-0.635 ; -0.635,-0.135 -0.635,-0.635 ; -0.635,0.135 -0.635,0.635 ; -0.635,1.135 -0.635,0.635 ; -0.5,0 0,0 ; -0.135,-0.635 -0.635,-0.635 ; -0.135,0.635 -0.635,0.635 ; 0,-0.5 0,0 ; 0,0.5 0,0 ; 0.135,-0.635 0.635,-0.635 ; 0.135,0.635 0.635,0.635 ; 0.5,0 0,0 ; 0.635,-1.135 0.635,-0.635 ; 0.635,-0.135 0.635,-0.635 ; 0.635,0.135 0.635,0.635 ; 0.635,1.135 0.635,0.635 ; 1.135,-0.635 0.635,-0.635 ; 1.135,0.635 0.635,0.635 ; 2.04,-2.54 2.54,-2.54 ; 2.04,2.54 2.54,2.54 ; 2.54,-3.04 2.54,-2.54 ; 2.54,-2.04 2.54,-2.54 ; 2.54,2.04 2.54,2.54 ; 2.54,3.04 2.54,2.54 ; 3.04,-2.54 2.54,-2.54 ; 3.04,2.54 2.54,2.54
Mechanical 14:
  circle w0.1: c13,0 r0.5
  circle w0.1: c0,0 r3.5
  lines w0.1: 3.5,-3.4 13.8,-3.4 ; 3.5,3.399 13.8,3.4 ; 13.8,-3.4 13.8,3.4 ; 13.8,-3.4 14,-3.2 14,3.2 13.8,3.4 ; -3.5,-3.5 -3.5,3.5 3.5,3.5 3.5,-3.5 -3.5,-3.5
  text "2" at 1.648,-1.108 h0.97
  text "3" at 1.652,0.208 h0.97
  text "4" at -2.231,0.232 h0.97
  text "1" at -2.007,-1.048 h0.97
3D body: height 7, standoff -3, extent -3.5,-3.5 14,3.5

## LEMO_EPG.0B.302.HLN [mm] "Elbow Receptacle (90°) With 2 Female Contacts and Key (G) For PCB"
height 12.7
pads (6):
  round 1.6 hole 0.9: 1(0,-1.27) 2(0,1.27) 3(-2.54,-3.81) 3(-2.54,3.81) 3(5.08,-3.81) 3(5.08,3.81)
Top Overlay:
  lines w0.2: -1.32,-5.85 ccw(c-8.876,0) 0.386,-2.353 ; -1.32,5.85 cw(c-8.876,0) 0.386,2.353 ; 0.674,-0.338 ccw(c-8.876,0) 0.674,0.338 ; 7.98,-4.5 19.28,-4.5 ; 7.98,4.5 19.28,4.5 ; 19.28,-4.5 19.28,4.5 ; 19.28,-4.5 19.68,-4.1 19.68,4.1 19.28,4.5 ; -5.32,-5.85 7.98,-5.85 7.98,5.85 -5.32,5.85 -5.32,-5.85
  text "1" at 1.275,-1.75 h0.97
  text "2" at 1.186,0.787 h0.97
  text "3" at -2.975,1.625 h0.97
Mechanical 14:
  circle w0.1: c-2.54,3.81 r0.4
  circle w0.1: c5.08,3.81 r0.4
  circle w0.1: c5.08,-3.81 r0.4
  circle w0.1: c-2.54,-3.81 r0.4
  circle w0.1: c0,-1.27 r0.4
  circle w0.1: c0,1.27 r0.4
  lines w0.1: -1.32,-5.85 ccw(c-8.876,0) -1.32,5.85 ; 7.98,-4.5 19.28,-4.5 ; 7.98,4.5 19.28,4.5 ; 19.28,-4.5 19.28,4.5 ; 19.28,-4.5 19.68,-4.1 19.68,4.1 19.28,4.5 ; -5.32,-5.85 7.98,-5.85 7.98,5.85 -5.32,5.85 -5.32,-5.85
  text "1" at 1.275,-1.75 h0.97
  text "2" at 1.186,0.787 h0.97
  text "3" at -2.975,1.625 h0.97
3D body: height 12.7, standoff -4, extent -5.32,-5.85 19.68,5.85

## LEMO_EPG.0B.304.HLN [mm] "Elbow Receptacle (90°) With 4 Female Contacts and Key (G) For PCB"
height 12.7
pads (8):
  round 1.6 hole 0.9: 1(0,-1.27) 2(2.54,-1.27) 3(2.54,1.27) 4(0,1.27) 5(-2.54,-3.81) 5(-2.54,3.81) 5(5.08,-3.81) 5(5.08,3.81)
Top Overlay:
  lines w0.2: -1.32,-5.85 ccw(c-8.876,0) 0.386,-2.353 ; -1.32,5.85 cw(c-8.876,0) 0.386,2.353 ; 0.674,-0.338 ccw(c-8.876,0) 0.674,0.338 ; 7.98,-4.5 19.28,-4.5 ; 7.98,4.5 19.28,4.5 ; 19.28,-4.5 19.28,4.5 ; 19.28,-4.5 19.68,-4.1 19.68,4.1 19.28,4.5 ; -5.32,-5.85 7.98,-5.85 7.98,5.85 -5.32,5.85 -5.32,-5.85
  text "4" at -1.773,0.79 h0.97
  text "3" at 3.599,0.787 h0.97
  text "1" at -1.519,-1.75 h0.97
  text "2" at 3.599,-1.753 h0.97
Mechanical 8:
  lines w0.1: -3.54,-3.81 -2.54,-3.81 ; -3.54,3.81 -2.54,3.81 ; -2.54,-4.81 -2.54,-3.81 ; -2.54,-2.81 -2.54,-3.81 ; -2.54,2.81 -2.54,3.81 ; -2.54,4.81 -2.54,3.81 ; -1.54,-3.81 -2.54,-3.81 ; -1.54,3.81 -2.54,3.81 ; -1,-1.27 0,-1.27 ; -1,0 0,0 ; -1,1.27 0,1.27 ; 0,-2.27 0,-1.27 ; 0,-1 0,0 ; 0,-0.27 0,-1.27 ; 0,0.27 0,1.27 ; 0,1 0,0 ; 0,2.27 0,1.27 ; 1,-1.27 0,-1.27 ; 1,0 0,0 ; 1,1.27 0,1.27 ; 1.54,-1.27 2.54,-1.27 ; 1.54,1.27 2.54,1.27 ; 2.54,-2.27 2.54,-1.27 ; 2.54,-0.27 2.54,-1.27 ; 2.54,0.27 2.54,1.27 ; 2.54,2.27 2.54,1.27 ; 3.54,-1.27 2.54,-1.27 ; 3.54,1.27 2.54,1.27 ; 4.08,-3.81 5.08,-3.81 ; 4.08,3.81 5.08,3.81 ; 5.08,-4.81 5.08,-3.81 ; 5.08,-2.81 5.08,-3.81 ; 5.08,2.81 5.08,3.81 ; 5.08,4.81 5.08,3.81 ; 6.08,-3.81 5.08,-3.81 ; 6.08,3.81 5.08,3.81
Mechanical 14:
  circle w0.1: c-2.54,3.81 r0.4
  circle w0.1: c5.08,3.81 r0.4
  circle w0.1: c5.08,-3.81 r0.4
  circle w0.1: c-2.54,-3.81 r0.4
  circle w0.1: c0,-1.27 r0.4
  circle w0.1: c0,1.27 r0.4
  circle w0.1: c2.54,1.27 r0.4
  circle w0.1: c2.54,-1.27 r0.4
  lines w0.1: -1.32,-5.85 ccw(c-8.876,0) -1.32,5.85 ; 7.98,-4.5 19.28,-4.5 ; 7.98,4.5 19.28,4.5 ; 19.28,-4.5 19.28,4.5 ; 19.28,-4.5 19.68,-4.1 19.68,4.1 19.28,4.5 ; -5.32,-5.85 7.98,-5.85 7.98,5.85 -5.32,5.85 -5.32,-5.85
  text "4" at -1.773,0.79 h0.97
  text "3" at 3.599,0.787 h0.97
  text "1" at -1.519,-1.75 h0.97
  text "2" at 3.599,-1.753 h0.97
3D body: height 12.7, standoff -4, extent -5.32,-5.85 19.68,5.85

## LEMO_EPG.1B.308.HLN [mm] "Elbow Receptacle (90°) With 8 Female Contacts and Key For PCB"
height 14
pads (12):
  round 1.5 hole 0.9: 1(-2.54,0) 2(-3.81,-1.27) 3(-1.27,-1.27) 4(1.27,-1.27) 5(1.27,1.27) 6(-1.27,1.27) 7(-3.81,1.27) 8(0,0) 9(-3.81,-3.81) 9(-3.81,3.81) 9(3.81,-3.81) 9(3.81,3.81)
Top Overlay:
  lines w0.2: -1.875,-6.3 ccw(c-10.879,0) 0.05,-1.149 ; -1.875,6.3 cw(c-10.879,0) 0.05,1.149 ; 6.71,-5.5 20.01,-5.5 ; 6.71,5.5 20.01,5.5 ; 20.01,-5.5 20.01,5.5 ; 20.01,-5.5 20.41,-5.26 20.41,5.26 20.01,5.5 ; -6.59,-6.05 -6.34,-6.3 6.71,-6.3 6.71,6.3 -6.34,6.3 -6.59,6.05 -6.59,-6.05
  lines w0.254: -4.9,0.025 -3.775,0.025 ; 1.25,0.025 2.375,0.025
  text "4" at 0.873,-3.863 h1.2
  text "5" at 0.873,2.662 h1.2
  text "6" at -2.192,2.662 h1.2
  text "3" at -2.192,-3.863 h1.2
  text "8" at 2.938,-0.513 h1.2
  text "7" at -5.937,1.277 h1.2
  text "2" at -5.887,-2.288 h1.2
  text "1" at -5.862,-0.413 h1.2
Mechanical 8:
  circle w0.1: c-3.81,3.81 r0.75
  circle w0.1: c-1.27,1.27 r0.75
  circle w0.1: c-2.54,0 r0.75
  circle w0.1: c0,0 r0.75
  circle w0.1: c1.27,1.27 r0.75
  circle w0.1: c1.27,-1.27 r0.75
  circle w0.1: c-1.27,-1.27 r0.75
  circle w0.1: c-3.81,-1.27 r0.75
  circle w0.1: c-3.81,1.27 r0.75
  circle w0.1: c-3.81,-3.81 r0.75
  circle w0.1: c3.81,-3.81 r0.75
  circle w0.1: c3.81,3.81 r0.75
  lines w0.1: -4.31,-3.81 -3.81,-3.81 ; -4.31,-1.27 -3.81,-1.27 ; -4.31,1.27 -3.81,1.27 ; -4.31,3.81 -3.81,3.81 ; -3.81,-4.31 -3.81,-3.81 ; -3.81,-3.31 -3.81,-3.81 ; -3.81,-1.77 -3.81,-1.27 ; -3.81,-0.77 -3.81,-1.27 ; -3.81,0.77 -3.81,1.27 ; -3.81,1.77 -3.81,1.27 ; -3.81,3.31 -3.81,3.81 ; -3.81,4.31 -3.81,3.81 ; -3.31,-3.81 -3.81,-3.81 ; -3.31,-1.27 -3.81,-1.27 ; -3.31,1.27 -3.81,1.27 ; -3.31,3.81 -3.81,3.81 ; -3.04,0 -2.54,0 ; -2.54,-0.5 -2.54,0 ; -2.54,0.5 -2.54,0 ; -2.04,0 -2.54,0 ; -1.77,-1.27 -1.27,-1.27 ; -1.77,1.27 -1.27,1.27 ; -1.27,-1.77 -1.27,-1.27 ; -1.27,-0.77 -1.27,-1.27 ; -1.27,0.77 -1.27,1.27 ; -1.27,1.77 -1.27,1.27 ; -0.77,-1.27 -1.27,-1.27 ; -0.77,1.27 -1.27,1.27 ; -0.5,0 0,0 ; 0,-0.5 0,0 ; 0,0.5 0,0 ; 0.5,0 0,0 ; 0.77,-1.27 1.27,-1.27 ; 0.77,1.27 1.27,1.27 ; 1.27,-1.77 1.27,-1.27 ; 1.27,-0.77 1.27,-1.27 ; 1.27,0.77 1.27,1.27 ; 1.27,1.77 1.27,1.27 ; 1.77,-1.27 1.27,-1.27 ; 1.77,1.27 1.27,1.27 ; 3.31,-3.81 3.81,-3.81 ; 3.31,3.81 3.81,3.81 ; 3.81,-4.31 3.81,-3.81 ; 3.81,-3.31 3.81,-3.81 ; 3.81,3.31 3.81,3.81 ; 3.81,4.31 3.81,3.81 ; 4.31,-3.81 3.81,-3.81 ; 4.31,3.81 3.81,3.81
Mechanical 14:
  lines w0.1: -3.29,0 ccw(c-2.54,0) -2.54,-0.75 ; -3.28,-0.74 -3.07,-0.53 ; -3.098,1.033 -0.712,0.237 ; -3.06,-1.27 -2.02,-1.27 ; -3.06,1.27 -2.02,1.27 ; -1.875,-6.3 ccw(c-10.879,0) -0.033,-1.77 ; -1.875,6.3 cw(c-10.879,0) -0.033,1.77 ; -0.52,-1.27 0.52,-1.27 ; -0.52,1.27 0.52,1.27 ; 1.27,-0.52 1.27,0.52 ; 6.71,-5.5 20.01,-5.5 ; 6.71,5.5 20.01,5.5 ; 20.01,-5.5 20.01,5.5 ; 20.01,-5.5 20.41,-5.26 20.41,5.26 20.01,5.5 ; -6.59,-6.05 -6.34,-6.3 6.71,-6.3 6.71,6.3 -6.34,6.3 -6.59,6.05 -6.59,-6.05
  text "4" at 0.873,-3.863 h1.2
  text "5" at 0.873,2.662 h1.2
  text "6" at -2.192,2.662 h1.2
  text "3" at -2.192,-3.863 h1.2
  text "8" at 2.938,-0.513 h1.2
  text "7" at -5.937,1.277 h1.2
  text "2" at -5.887,-2.288 h1.2
  text "1" at -5.862,-0.413 h1.2
3D body: height 14, standoff -3.2, extent -6.59,-6.3 20.41,6.3